# Altium footprint library TranDangKhoa-LIB.PcbLib: 1435 footprints (part 74 of 90)
Each footprint in its own frame and in the unit in brackets; x right, y up, seen from the top. Pads: shape width x height; smd on the part's side, far side on the other; paste and mask are expansions set on the pad; w line width, h text height; cw(c..) or ccw(c..) is an arc to the next point about the centre after c.
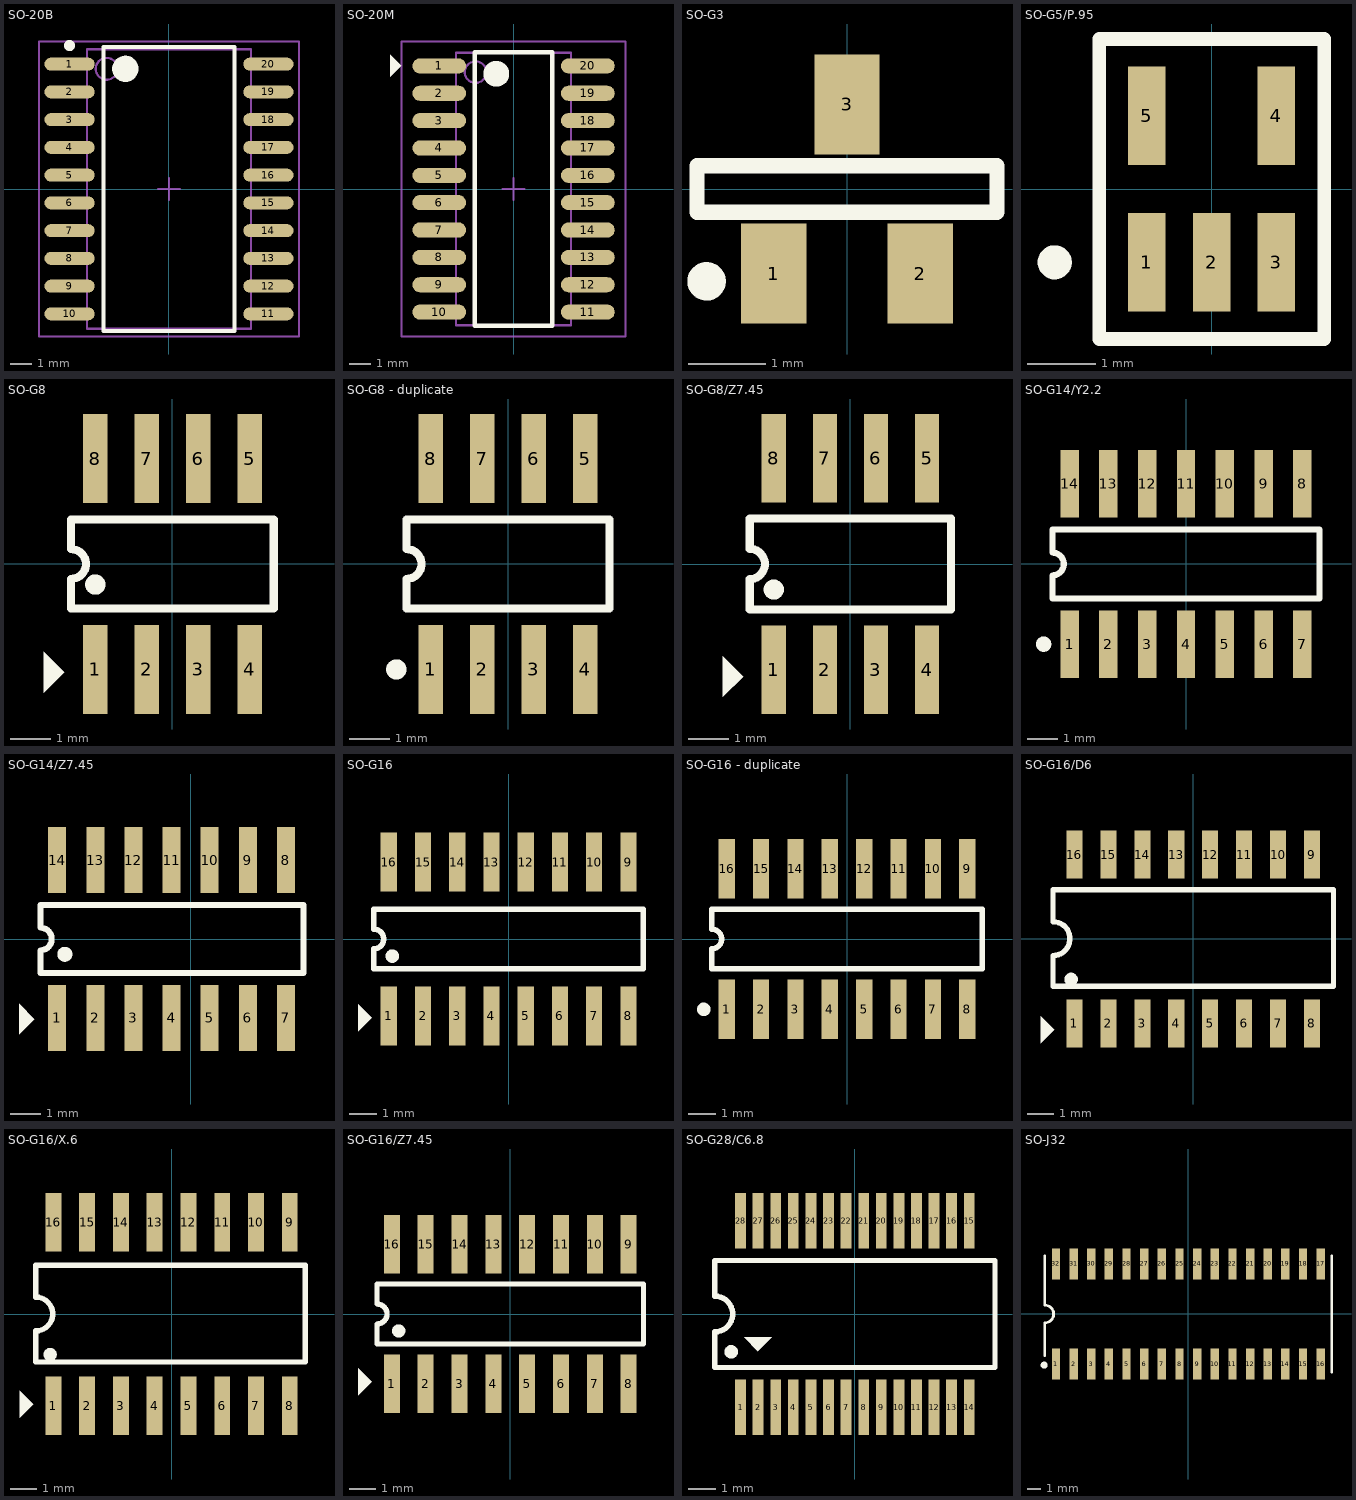
[diagram p73: the footprints below, top view; thin cyan lines are the x and y axes]

## SO-20B [mm] "SOIC, 20-Leads, Body 12.8x7.5mm, Pitch 1.27mm, IPC Medium Density"
height 2.6
pads (20):
  oval 2.3x0.6 smd: 1(-4.55,5.715) 2(-4.55,4.445) 3(-4.55,3.175) 4(-4.55,1.905) 5(-4.55,0.635) 6(-4.55,-0.635) 7(-4.55,-1.905) 8(-4.55,-3.175) 9(-4.55,-4.445) 10(-4.55,-5.715) 11(4.55,-5.715) 12(4.55,-4.445) 13(4.55,-3.175) 14(4.55,-1.905) 15(4.55,-0.635) 16(4.55,0.635) 17(4.55,1.905) 18(4.55,3.175) 19(4.55,4.445) 20(4.55,5.715)
Top Overlay:
  circle w0.25: c-4.55,6.565 r0.125
  circle w0.6: c-2,5.5 r0.3
  lines w0.2: -3,-6.5 -3,6.5 3,6.5 3,-6.5 -3,-6.5
Mechanical 13:
  circle w0.1: c-2.85,5.5 r0.5
  lines w0.1: -3.75,-6.4 -3.75,6.4 3.75,6.4 3.75,-6.4 -3.75,-6.4
Mechanical 15:
  lines w0.1: -0.5,0 0.5,0 ; 0,-0.5 0,0.5 ; -5.95,-6.75 -5.95,6.75 5.95,6.75 5.95,-6.75 -5.95,-6.75
3D body "User Library-SOP20.STEP": height 1.95, standoff -0.05, extent -4.101,-6.325 3.999,6.375

## SO-20M [mm] "SOP, 20-Leads, Body 12.6x5.3mm, Pitch 1.27mm, IPC Low Density"
height 1.96
pads (20):
  oval 2.5x0.7 smd: 1(-3.45,5.715) 2(-3.45,4.445) 3(-3.45,3.175) 4(-3.45,1.905) 5(-3.45,0.635) 6(-3.45,-0.635) 7(-3.45,-1.905) 8(-3.45,-3.175) 9(-3.45,-4.445) 10(-3.45,-5.715) 11(3.45,-5.715) 12(3.45,-4.445) 13(3.45,-3.175) 14(3.45,-1.905) 15(3.45,-0.635) 16(3.45,0.635) 17(3.45,1.905) 18(3.45,3.175) 19(3.45,4.445) 20(3.45,5.715)
Top Overlay:
  circle w0.6: c-0.8,5.35 r0.3
  region: -5.715,5.207 -5.207,5.715 -5.715,6.223
  lines w0.2: -1.8,-6.35 1.8,-6.35 1.8,6.35 -1.8,6.35 -1.8,-6.35
Mechanical 13:
  circle w0.1: c-1.765,5.425 r0.5
  lines w0.1: -2.665,-6.325 2.665,-6.325 2.665,6.325 -2.665,6.325 -2.665,-6.325
Mechanical 15:
  lines w0.1: -0.5,0 0.5,0 ; 0,-0.5 0,0.5 ; -5.2,-6.85 5.2,-6.85 5.2,6.85 -5.2,6.85 -5.2,-6.85
3D body: height 1.96, standoff 0, extent -2.665,-6.325 2.665,6.325

## SO-G3 [mm]
pads (3):
  rect 0.85x1.3 smd: 1(-0.95,-1.1) 2(0.95,-1.1) 3(0,1.1)
Top Overlay:
  circle w0.25: c-1.825,-1.2 r0.125
  lines w0.2: -1.95,-0.3 1.95,-0.3 1.95,0.3 -1.95,0.3 -1.95,-0.3

## SO-G5/P.95 [mm]
pads (5):
  rect 0.55x1.45 smd: 1(-0.95,-1.075) 2(0,-1.075) 3(0.95,-1.075) 4(0.95,1.075) 5(-0.95,1.075)
Top Overlay:
  circle w0.25: c-2.3,-1.075 r0.125
  lines w0.2: -1.65,-2.2 -1.65,2.2 1.65,2.2 1.65,-2.2 -1.65,-2.2

## SO-G8 [mm] "Small Outline; 8 Leads; Body Width 3.9 mm; Pitch 1.27 mm"
height 1.75
pads (8):
  rect 0.6x2.2 smd: 1(-1.905,-2.6) 2(-0.635,-2.6) 3(0.635,-2.6) 4(1.905,-2.6) 5(1.905,2.6) 6(0.635,2.6) 7(-0.635,2.6) 8(-1.905,2.6)
Top Overlay:
  circle w0.25: c-1.903,-0.508 r0.125
  region: -3.175,-3.175 -2.667,-2.667 -3.175,-2.159
  lines w0.2: -2.5,-1.1 2.5,-1.1 2.5,1.1 -2.5,1.1 -2.5,0.367 cw(c-2.5,0) -2.5,-0.367 -2.5,-1.1

## SO-G8 - duplicate [mm]
pads (8):
  rect 0.6x2.2 smd: 1(-1.905,-2.6) 2(-0.635,-2.6) 3(0.635,-2.6) 4(1.905,-2.6) 5(1.905,2.6) 6(0.635,2.6) 7(-0.635,2.6) 8(-1.905,2.6)
Top Overlay:
  circle w0.25: c-2.755,-2.6 r0.125
  lines w0.2: -2.5,-1.1 -2.5,-0.367 ccw(c-2.5,0) -2.5,0.367 -2.5,1.1 2.5,1.1 2.5,-1.1 -2.5,-1.1

## SO-G8/Z7.45 [mm] "Small Outline; 8 Leads; Body Width 3.9 mm; Pitch 1.27 mm"
height 1.75
pads (8):
  rect 0.6x2.2 smd: 1(-1.905,-2.625) 2(-0.635,-2.625) 3(0.635,-2.625) 4(1.905,-2.625) 5(1.905,2.625) 6(0.635,2.625) 7(-0.635,2.625) 8(-1.905,2.625)
Top Overlay:
  circle w0.25: c-1.903,-0.635 r0.125
  region: -3.175,-3.302 -2.667,-2.794 -3.175,-2.286
  lines w0.2: -2.5,-1.125 -2.5,-0.375 ccw(c-2.5,0) -2.5,0.375 -2.5,1.125 2.5,1.125 2.5,-1.125 -2.5,-1.125

## SO-G14/Y2.2 [mm]
pads (14):
  rect 0.6x2.2 smd: 1(-3.81,-2.625) 2(-2.54,-2.625) 3(-1.27,-2.625) 4(0,-2.625) 5(1.27,-2.625) 6(2.54,-2.625) 7(3.81,-2.625) 8(3.81,2.625) 9(2.54,2.625) 10(1.27,2.625) 11(0,2.625) 12(-1.27,2.625) 13(-2.54,2.625) 14(-3.81,2.625)
Top Overlay:
  circle w0.25: c-4.66,-2.625 r0.125
  lines w0.2: -4.375,-1.125 -4.375,-0.375 ccw(c-4.375,0) -4.375,0.375 -4.375,1.125 4.375,1.125 4.375,-1.125 -4.375,-1.125

## SO-G14/Z7.45 [mm] "Small Outline; 14 Leads; Body Width 3.9 mm; Pitch 1.27 mm"
height 1.75
pads (14):
  rect 0.6x2.2 smd: 1(-4.445,-2.625) 2(-3.175,-2.625) 3(-1.905,-2.625) 4(-0.635,-2.625) 5(0.635,-2.625) 6(1.905,-2.625) 7(3.175,-2.625) 8(3.175,2.625) 9(1.905,2.625) 10(0.635,2.625) 11(-0.635,2.625) 12(-1.905,2.625) 13(-3.175,2.625) 14(-4.445,2.625)
Top Overlay:
  circle w0.25: c-4.189,-0.508 r0.125
  region: -5.715,-3.175 -5.207,-2.667 -5.715,-2.159
  lines w0.2: -5,-1.125 -5,-0.375 ccw(c-5,0) -5,0.375 -5,1.125 3.759,1.125 3.759,-1.125 -5,-1.125

## SO-G16 [mm] "Small Outline; 16 Leads; Body Width 3.9 mm; Pitch 1.27 mm"
height 1.75
pads (16):
  rect 0.6x2.2 smd: 1(-4.445,-2.854) 2(-3.175,-2.854) 3(-1.905,-2.854) 4(-0.635,-2.854) 5(0.635,-2.854) 6(1.905,-2.854) 7(3.175,-2.854) 8(4.445,-2.854) 9(4.445,2.854) 10(3.175,2.854) 11(1.905,2.854) 12(0.635,2.854) 13(-0.635,2.854) 14(-1.905,2.854) 15(-3.175,2.854) 16(-4.445,2.854)
Top Overlay:
  circle w0.25: c-4.316,-0.635 r0.125
  region: -5.588,-3.429 -5.08,-2.921 -5.588,-2.413
  lines w0.2: -5,-1.1 5,-1.1 5,1.1 -5,1.1 -5,0.367 cw(c-5,0) -5,-0.367 -5,-1.1
3D body "User Library-SOP16_208mil (5_3mm).STEP": height 2.01, standoff -0.4, extent -5.1,-3.966 5.1,4.049

## SO-G16 - duplicate [mm]
pads (16):
  rect 0.6x2.2 smd: 1(-4.445,-2.6) 2(-3.175,-2.6) 3(-1.905,-2.6) 4(-0.635,-2.6) 5(0.635,-2.6) 6(1.905,-2.6) 7(3.175,-2.6) 8(4.445,-2.6) 9(4.445,2.6) 10(3.175,2.6) 11(1.905,2.6) 12(0.635,2.6) 13(-0.635,2.6) 14(-1.905,2.6) 15(-3.175,2.6) 16(-4.445,2.6)
Top Overlay:
  circle w0.25: c-5.295,-2.6 r0.125
  lines w0.2: -5,-1.1 5,-1.1 5,1.1 -5,1.1 -5,0.367 cw(c-5,0) -5,-0.367 -5,-1.1

## SO-G16/D6 [mm] "Small Outline; 16 Leads; Body Width 5.3 mm; Pitch 1.27 mm"
height 2
pads (16):
  rect 0.6x1.8 smd: 1(-4.445,-3.168) 2(-3.175,-3.168) 3(-1.905,-3.168) 4(-0.635,-3.168) 5(0.635,-3.168) 6(1.905,-3.168) 7(3.175,-3.168) 8(4.445,-3.168) 9(4.445,3.143) 10(3.175,3.143) 11(1.905,3.143) 12(0.635,3.143) 13(-0.635,3.143) 14(-1.905,3.143) 15(-3.175,3.143) 16(-4.445,3.143)
Top Overlay:
  circle w0.25: c-4.57,-1.524 r0.125
  region: -5.715,-3.912 -5.207,-3.404 -5.715,-2.896
  lines w0.2: -5.25,-1.778 5.25,-1.778 5.25,1.829 -5.25,1.829 -5.25,0.635 cw(c-5.25,0) -5.25,-0.635 -5.25,-1.778

## SO-G16/X.6 [mm] "Small Outline; 16 Leads; Body Width 5.3 mm; Pitch 1.27 mm"
height 2
pads (16):
  rect 0.6x2.2 smd: 1(-4.445,-3.448) 2(-3.175,-3.448) 3(-1.905,-3.448) 4(-0.635,-3.448) 5(0.635,-3.448) 6(1.905,-3.448) 7(3.175,-3.448) 8(4.445,-3.448) 9(4.445,3.448) 10(3.175,3.448) 11(1.905,3.448) 12(0.635,3.448) 13(-0.635,3.448) 14(-1.905,3.448) 15(-3.175,3.448) 16(-4.445,3.448)
Top Overlay:
  circle w0.25: c-4.57,-1.524 r0.125
  region: -5.715,-3.912 -5.207,-3.404 -5.715,-2.896
  lines w0.2: -5.105,0.635 cw(c-5.105,0) -5.105,-0.635 -5.105,-1.803 5.029,-1.803 5.029,1.829 -5.105,1.829 -5.105,0.686

## SO-G16/Z7.45 [mm] "Small Outline; 16 Leads; Body Width 3.9 mm; Pitch 1.27 mm"
height 1.75
pads (16):
  rect 0.6x2.2 smd: 1(-4.445,-2.625) 2(-3.175,-2.625) 3(-1.905,-2.625) 4(-0.635,-2.625) 5(0.635,-2.625) 6(1.905,-2.625) 7(3.175,-2.625) 8(4.445,-2.625) 9(4.445,2.625) 10(3.175,2.625) 11(1.905,2.625) 12(0.635,2.625) 13(-0.635,2.625) 14(-1.905,2.625) 15(-3.175,2.625) 16(-4.445,2.625)
Top Overlay:
  circle w0.25: c-4.189,-0.635 r0.125
  region: -5.715,-3.048 -5.207,-2.54 -5.715,-2.032
  lines w0.2: -5,-1.125 -5,-0.375 ccw(c-5,0) -5,0.375 -5,1.125 5,1.125 5,-1.125 -5,-1.125

## SO-G28/C6.8 [mm] "SSOP, Plastic; 28 Leads; Body Width 5.3 mm; Pitch 0.65 mm"
height 1.99
pads (28):
  rect 0.4x2.05 smd: 1(-4.225,-3.451) 2(-3.575,-3.451) 3(-2.925,-3.451) 4(-2.275,-3.451) 5(-1.625,-3.451) 6(-0.975,-3.451) 7(-0.325,-3.451) 8(0.325,-3.451) 9(0.975,-3.451) 10(1.625,-3.451) 11(2.275,-3.451) 12(2.925,-3.451) 13(3.575,-3.451) 14(4.225,-3.451) 15(4.225,3.451) 16(3.575,3.451) 17(2.925,3.451) 18(2.275,3.451) 19(1.625,3.451) 20(0.975,3.451) 21(0.325,3.451) 22(-0.325,3.451) 23(-0.975,3.451) 24(-1.625,3.451) 25(-2.275,3.451) 26(-2.925,3.451) 27(-3.575,3.451) 28(-4.225,3.451)
Top Overlay:
  circle w0.25: c-4.57,-1.397 r0.125
  region: -4.089,-0.864 -3.581,-1.372 -3.073,-0.864
  lines w0.2: -5.175,-1.975 5.175,-1.975 5.175,1.975 -5.175,1.975 -5.175,0.658 cw(c-5.175,0) -5.175,-0.658 -5.175,-1.975
3D body: height 1.14, standoff 1.02, extent -4.804,-1.748 -4.296,-1.24
3D body: height 1.27, standoff 1.02, extent 2.794,-0.33 3.708,1.067
3D body: height 1.27, standoff 1.02, extent 1.524,-0.305 2.54,1.092
3D body: height 1.27, standoff 1.02, extent 0.254,-0.305 1.168,1.092
3D body: height 1.27, standoff 1.02, extent -0.914,-0.305 -0.102,1.092
3D body: height 1.27, standoff 1.02, extent -3.175,-0.305 -2.362,1.092
3D body: height 1.27, standoff 1.02, extent -2.032,-0.305 -1.245,1.092
3D body: height 0.25, standoff 0, extent -3.759,2.032 -3.378,3.429
3D body: height 0.25, standoff 0, extent -4.42,2.032 -4.039,3.429
3D body: height 0.25, standoff 0, extent -3.124,2.007 -2.743,3.404
3D body: height 0.25, standoff 0, extent -2.464,2.007 -2.083,3.404
3D body: height 0.25, standoff 0, extent -1.829,2.007 -1.448,3.404
3D body: height 0.25, standoff 0, extent -1.168,2.007 -0.787,3.404
3D body: height 0.25, standoff 0, extent -0.508,2.007 -0.127,3.404
3D body: height 0.25, standoff 0, extent 0.152,2.007 0.533,3.404
3D body: height 0.25, standoff 0, extent 0.762,2.007 1.143,3.404
3D body: height 0.25, standoff 0, extent 1.422,2.007 1.803,3.404
3D body: height 0.25, standoff 0, extent 2.083,2.007 2.464,3.404
3D body: height 0.25, standoff 0, extent 2.743,2.007 3.124,3.404
3D body: height 0.25, standoff 0, extent 3.378,2.007 3.759,3.404
3D body: height 0.25, standoff 0, extent 4.039,2.007 4.42,3.404
3D body: height 0.25, standoff 0, extent 4.039,-3.454 4.42,-2.057
3D body: height 0.25, standoff 0, extent 3.378,-3.454 3.759,-2.057
3D body: height 0.25, standoff 0, extent 2.743,-3.454 3.124,-2.057
3D body: height 0.25, standoff 0, extent 2.083,-3.454 2.464,-2.057
3D body: height 0.25, standoff 0, extent 1.422,-3.454 1.803,-2.057
3D body: height 0.25, standoff 0, extent 0.762,-3.454 1.143,-2.057
3D body: height 0.25, standoff 0, extent 0.152,-3.454 0.533,-2.057
3D body: height 0.25, standoff 0, extent -0.508,-3.454 -0.127,-2.057
3D body: height 0.25, standoff 0, extent -1.168,-3.454 -0.787,-2.057
3D body: height 0.25, standoff 0, extent -1.829,-3.454 -1.448,-2.057
3D body: height 0.25, standoff 0, extent -2.464,-3.454 -2.083,-2.057
3D body: height 0.25, standoff 0, extent -3.124,-3.454 -2.743,-2.057
3D body: height 1.02, standoff 0.23, extent -5.156,-1.981 5.258,2.083
3D body: height 0.25, standoff 0, extent -4.42,-3.429 -4.039,-2.032
3D body: height 0.25, standoff 0, extent -3.759,-3.429 -3.378,-2.032

## SO-J32 [mm]
pads (32):
  rect 0.6x2.2 smd: 1(-9.525,-3.6) 2(-8.255,-3.6) 3(-6.985,-3.6) 4(-5.715,-3.6) 5(-4.445,-3.6) 6(-3.175,-3.6) 7(-1.905,-3.6) 8(-0.635,-3.6) 9(0.635,-3.6) 10(1.905,-3.6) 11(3.175,-3.6) 12(4.445,-3.6) 13(5.715,-3.6) 14(6.985,-3.6) 15(8.255,-3.6) 16(9.525,-3.6) 17(9.525,3.6) 18(8.255,3.6) 19(6.985,3.6) 20(5.715,3.6) 21(4.445,3.6) 22(3.175,3.6) 23(1.905,3.6) 24(0.635,3.6) 25(-0.635,3.6) 26(-1.905,3.6) 27(-3.175,3.6) 28(-4.445,3.6) 29(-5.715,3.6) 30(-6.985,3.6) 31(-8.255,3.6) 32(-9.525,3.6)
Top Overlay:
  circle w0.25: c-10.375,-3.676 r0.125
  lines w0.2: -10.325,-2.996 -10.325,-0.635 ccw(c-10.325,0) -10.325,0.635 -10.325,4.191 ; 10.325,-4.191 10.325,4.191